# Altium integrated library Lattice CPLD ispLSI.IntLib: 471 symbols (part 13 of 26) (continued)
## ispLSI2192VE-100LB144 (continued)

## ispLSI2192VE-100LT128
designator U?
3.3V In-System Programmable SuperFAST High Density PLD; Published: 17-Jul-2002; LatestRevisionDate: 13-Apr-2006; LatestRevisionNote: IPC-7351 Footprint Added.; DatasheetVersion: Sep-2000; PackageVersion: Aug-2005; PackageReference: TQFP128; Publisher: Altium Limited; PackageDescription: 128-Pin Thin Quad Flat Pack 0.4 mm Pitch; ComponentLink1Description: Manufacturer Link; ComponentLink1URL: http://www.latticesemi.com/products/mature/index.cfm; ComponentLink2Description: Datasheet; ComponentLink2URL: http://www.latticesemi.com/account/_download.cfm?AMID=649
footprint TQFP128_N (Thin QFP, 128-Leads, Body 14x14mm, Pitch 0.4mm, IPC Medium Density)
footprint TQFP128_L (Thin QFP, 128-Leads, Body 14x14mm, Pitch 0.4mm, IPC High Density)
footprint TQFP128_M (Thin QFP, 128-Leads, Body 14x14mm, Pitch 0.4mm, IPC Low Density)
3D model 2192VE-TQFP128 (128-Pin Thin Quad Flat Pack 0.4 mm Pitch)
pins: 1 I/O85 (io), 2 VCC (power), 3 I/O86 (io), 4 I/O87 (io), 5 I/O88 (io), 6 I/O89 (io), 7 I/O90 (io), 8 I/O91 (io), 9 I/O92 (io), 10 I/O93 (io), 11 I/O94 (io), 12 I/O95 (io), 13 IN10 (in), 14 Y0 (in), 15 ~{RESE}T (in), 16 VCC (power), 17 GOE1 (in), 18 GND (power), 19 ~{BSCAN} (in), 20 TDI/IN0 (in), 21 I/O0 (io), 22 I/O1 (io), 23 I/O2 (io), 24 I/O3 (io), 25 I/O4 (io), 26 I/O5 (io), 27 I/O6 (io), 28 I/O7 (io), 29 I/O8 (io), 30 I/O9 (io), 31 VCC (power), 32 I/O10 (io), 33 I/O11 (io), 34 GND (power), 35 I/O12 (io), 36 I/O13 (io), 37 I/O14 (io), 38 I/O15 (io), 39 I/O16 (io), 40 I/O17 (io), 41 I/O18 (io), 42 I/O19 (io), 43 I/O20 (io), 44 I/O21 (io), 45 I/O22 (io), 46 I/O23 (io), 47 VCC (power), 48 TMS/IN1 (in), 49 IN3 (in), 50 GND (power), 51 I/O24 (io), 52 I/O25 (io), 53 I/O26 (io), 54 I/O27 (io), 55 I/O28 (io), 56 I/O29 (io), 57 I/O30 (io), 58 I/O31 (io), 59 I/O32 (io), 60 I/O33 (io), 61 I/O34 (io), 62 I/O35 (io), 63 GND (power), 64 I/O36 (io), 65 I/O37 (io), 66 VCC (power), 67 I/O38 (io), 68 I/O39 (io), 69 I/O40 (io), 70 I/O41 (io), 71 I/O42 (io), 72 I/O43 (io), 73 I/O44 (io), 74 I/O45 (io), 75 I/O46 (io), 76 I/O47 (io), 77 TCK/IN7 (in), 78 Y2 (in), 79 GND (power), 80 GOE0 (in), 81 VCC (power), 82 IN4 (in), 83 Y1 (in), 84 IN8 (in), 85 I/O48 (io), 86 I/O49 (io), 87 I/O50 (io), 88 I/O51 (io), 89 I/O52 (io), 90 I/O53 (io), 91 I/O54 (io), 92 I/O55 (io), 93 I/O56 (io), 94 I/O57 (io), 95 VCC (power), 96 I/O58 (io), 97 I/O59 (io), 98 GND (power), 99 I/O60 (io), 100 I/O61 (io), 101 I/O62 (io), 102 I/O63 (io), 103 I/O64 (io), 104 I/O65 (io), 105 I/O66 (io), 106 I/O67 (io), 107 I/O68 (io), 108 I/O69 (io), 109 I/O70 (io), 110 I/O71 (io), 111 GND (power), 112 TDO/IN6 (io), 113 IN9 (in), 114 VCC (power), 115 I/O72 (io), 116 I/O73 (io), 117 I/O74 (io), 118 I/O75 (io), 119 I/O76 (io), 120 I/O77 (io), 121 I/O78 (io), 122 I/O79 (io), 123 I/O80 (io), 124 I/O81 (io), 125 I/O82 (io), 126 I/O83 (io), 127 GND (power), 128 I/O84 (io)

## ispLSI2192VE-135LB144
designator U?
3.3V In-System Programmable SuperFAST High Density PLD; Published: 17-Jul-2002; LatestRevisionDate: 13-Apr-2006; LatestRevisionNote: IPC-7351 Footprint Added.; DatasheetVersion: Sep-2000; PackageVersion: pkg_32, Aug-2005; PackageReference: fpBGA144; Publisher: Altium Limited; PackageDescription: 144-Ball Fine Pitch Ball Grid Array (fpBGA144); Code_IPC: BGA100P12X12-144; ComponentLink1Description: Manufacturer Link; ComponentLink1URL: http://www.latticesemi.com/products/mature/index.cfm; ComponentLink2Description: Datasheet; ComponentLink2URL: http://www.latticesemi.com/account/_download.cfm?AMID=649
footprint fpBGA144 (BGA, 144-Leads, Body 13x13mm, Pitch 1mm)
3D model 2192VE-fpBGA144 (144-Ball Fine Pitch Ball Grid Array (fpBGA144))
pins: A1 GND (power), A2 I/O88 (io), A3 I/O84 (io), A4 I/O81 (io), A5 I/O77 (io), A6 I/O73 (io), A7 I/O70 (io), A8 I/O68 (io), A9 I/O64 (io), A10 I/O61 (io), A11 I/O59 (io), A12 GND (power), B1 VCC (power), B2 I/O86 (io), B3 I/O83 (io), B4 I/O80 (io), B5 I/O75 (io), B6 IN9 (in), B7 I/O69 (io), B8 I/O66 (io), B9 I/O63 (io), B10 I/O60 (io), B11 I/O56 (io), B12 VCC (power), C1 I/O91 (io), C2 I/O85 (io), C3 I/O82 (io), C4 I/O79 (io), C5 I/O76 (io), C6 I/O72 (io), C7 TDO/IN6 (io), C8 I/O67 (io), C9 I/O62 (io), C10 I/O58 (io), C11 I/O57 (io), C12 I/O53 (io), D1 I/O94 (io), D2 I/O87 (io), D3 I/O89 (io), D4 GND (power), D5 I/O78 (io), D6 I/O74 (io), D7 I/O71 (io), D8 I/O65 (io), D9 GND (power), D10 I/O54 (io), D11 I/O55 (io), D12 I/O49 (io), E1 IN11 (in), E2 I/O90 (io), E3 I/O92 (io), E4 I/O93 (io), E5 GND (power), E6 VCC (power), E7 VCC (power), E8 GND (power), E9 I/O50 (io), E10 I/O51 (io), E11 I/O52 (io), E12 IN8 (in), F1 ~{BSCAN} (in), F2 IN10 (in), F3 Y0 (in), F4 I/O95 (io), F5 VCC (power), F6 GND (power), F7 GND (power), F8 VCC (power), F9 IN4 (in), F10 Y1 (in), F11 I/O48 (io), F12 GOE0 (in), G1 I/O1 (io), G2 GOE1 (in), G3 TDI/IN0 (in), G4 ~{RESET} (in), G5 VCC (power), G6 GND (power), G7 GND (power), G8 VCC (power), G9 I/O47 (io), G10 IN5 (in), G11 Y2 (in), G12 TCK/IN7 (in), H1 I/O3 (io), H2 I/O2 (io), H3 I/O4 (io), H4 I/O0 (io), H5 GND (power), H6 VCC (power), H7 VCC (power), H8 GND (power), H9 I/O43 (io), H10 I/O46 (io), H11 I/O44 (io), H12 I/O45 (io), J1 I/O5 (io), J2 I/O8 (io), J3 I/O6 (io), J4 GND (power), J5 I/O17 (io), J6 TMS/IN1 (in), J7 IN3 (in), J8 I/O26 (io), J9 GND (power), J10 I/O42 (io), J11 I/O40 (io), J12 I/O41 (io), K1 I/O7 (io), K2 NC, K3 I/O12 (io), K4 I/O15 (io), K5 I/O19 (io), K6 I/O23 (io), K7 I/O25 (io), K8 I/O29 (io), K9 I/O32 (io), K10 I/O36 (io), K11 I/O37 (io), K12 I/O39 (io), L1 VCC (power), L2 I/O10 (io), L3 I/O11 (io), L4 I/O14 (io), L5 I/O20 (io), L6 I/O22 (io), L7 I/O24 (io), L8 I/O28 (io), L9 I/O31 (io), L10 I/O34 (io), L11 I/O38 (io), L12 VCC (power), M1 GND (power), M2 I/O9 (io), M3 I/O13 (io), M4 I/O16 (io), M5 I/O18 (io), M6 I/O21 (io), M7 IN2 (in), M8 I/O27 (io), M9 I/O30 (io), M10 I/O33 (io), M11 I/O35 (io), M12 GND (power)

## ispLSI2192VE-135LT128
designator U?
3.3V In-System Programmable SuperFAST High Density PLD; Published: 17-Jul-2002; LatestRevisionDate: 13-Apr-2006; LatestRevisionNote: IPC-7351 Footprint Added.; DatasheetVersion: Sep-2000; PackageVersion: Aug-2005; PackageReference: TQFP128; Publisher: Altium Limited; PackageDescription: 128-Pin Thin Quad Flat Pack 0.4 mm Pitch; ComponentLink1Description: Manufacturer Link; ComponentLink1URL: http://www.latticesemi.com/products/mature/index.cfm; ComponentLink2Description: Datasheet; ComponentLink2URL: http://www.latticesemi.com/account/_download.cfm?AMID=649
footprint TQFP128_N (Thin QFP, 128-Leads, Body 14x14mm, Pitch 0.4mm, IPC Medium Density)
footprint TQFP128_L (Thin QFP, 128-Leads, Body 14x14mm, Pitch 0.4mm, IPC High Density)
footprint TQFP128_M (Thin QFP, 128-Leads, Body 14x14mm, Pitch 0.4mm, IPC Low Density)
3D model 2192VE-TQFP128 (128-Pin Thin Quad Flat Pack 0.4 mm Pitch)
pins: 1 I/O85 (io), 2 VCC (power), 3 I/O86 (io), 4 I/O87 (io), 5 I/O88 (io), 6 I/O89 (io), 7 I/O90 (io), 8 I/O91 (io), 9 I/O92 (io), 10 I/O93 (io), 11 I/O94 (io), 12 I/O95 (io), 13 IN10 (in), 14 Y0 (in), 15 ~{RESE}T (in), 16 VCC (power), 17 GOE1 (in), 18 GND (power), 19 ~{BSCAN} (in), 20 TDI/IN0 (in), 21 I/O0 (io), 22 I/O1 (io), 23 I/O2 (io), 24 I/O3 (io), 25 I/O4 (io), 26 I/O5 (io), 27 I/O6 (io), 28 I/O7 (io), 29 I/O8 (io), 30 I/O9 (io), 31 VCC (power), 32 I/O10 (io), 33 I/O11 (io), 34 GND (power), 35 I/O12 (io), 36 I/O13 (io), 37 I/O14 (io), 38 I/O15 (io), 39 I/O16 (io), 40 I/O17 (io), 41 I/O18 (io), 42 I/O19 (io), 43 I/O20 (io), 44 I/O21 (io), 45 I/O22 (io), 46 I/O23 (io), 47 VCC (power), 48 TMS/IN1 (in), 49 IN3 (in), 50 GND (power), 51 I/O24 (io), 52 I/O25 (io), 53 I/O26 (io), 54 I/O27 (io), 55 I/O28 (io), 56 I/O29 (io), 57 I/O30 (io), 58 I/O31 (io), 59 I/O32 (io), 60 I/O33 (io), 61 I/O34 (io), 62 I/O35 (io), 63 GND (power), 64 I/O36 (io), 65 I/O37 (io), 66 VCC (power), 67 I/O38 (io), 68 I/O39 (io), 69 I/O40 (io), 70 I/O41 (io), 71 I/O42 (io), 72 I/O43 (io), 73 I/O44 (io), 74 I/O45 (io), 75 I/O46 (io), 76 I/O47 (io), 77 TCK/IN7 (in), 78 Y2 (in), 79 GND (power), 80 GOE0 (in), 81 VCC (power), 82 IN4 (in), 83 Y1 (in), 84 IN8 (in), 85 I/O48 (io), 86 I/O49 (io), 87 I/O50 (io), 88 I/O51 (io), 89 I/O52 (io), 90 I/O53 (io), 91 I/O54 (io), 92 I/O55 (io), 93 I/O56 (io), 94 I/O57 (io), 95 VCC (power), 96 I/O58 (io), 97 I/O59 (io), 98 GND (power), 99 I/O60 (io), 100 I/O61 (io), 101 I/O62 (io), 102 I/O63 (io), 103 I/O64 (io), 104 I/O65 (io), 105 I/O66 (io), 106 I/O67 (io), 107 I/O68 (io), 108 I/O69 (io), 109 I/O70 (io), 110 I/O71 (io), 111 GND (power), 112 TDO/IN6 (io), 113 IN9 (in), 114 VCC (power), 115 I/O72 (io), 116 I/O73 (io), 117 I/O74 (io), 118 I/O75 (io), 119 I/O76 (io), 120 I/O77 (io), 121 I/O78 (io), 122 I/O79 (io), 123 I/O80 (io), 124 I/O81 (io), 125 I/O82 (io), 126 I/O83 (io), 127 GND (power), 128 I/O84 (io)

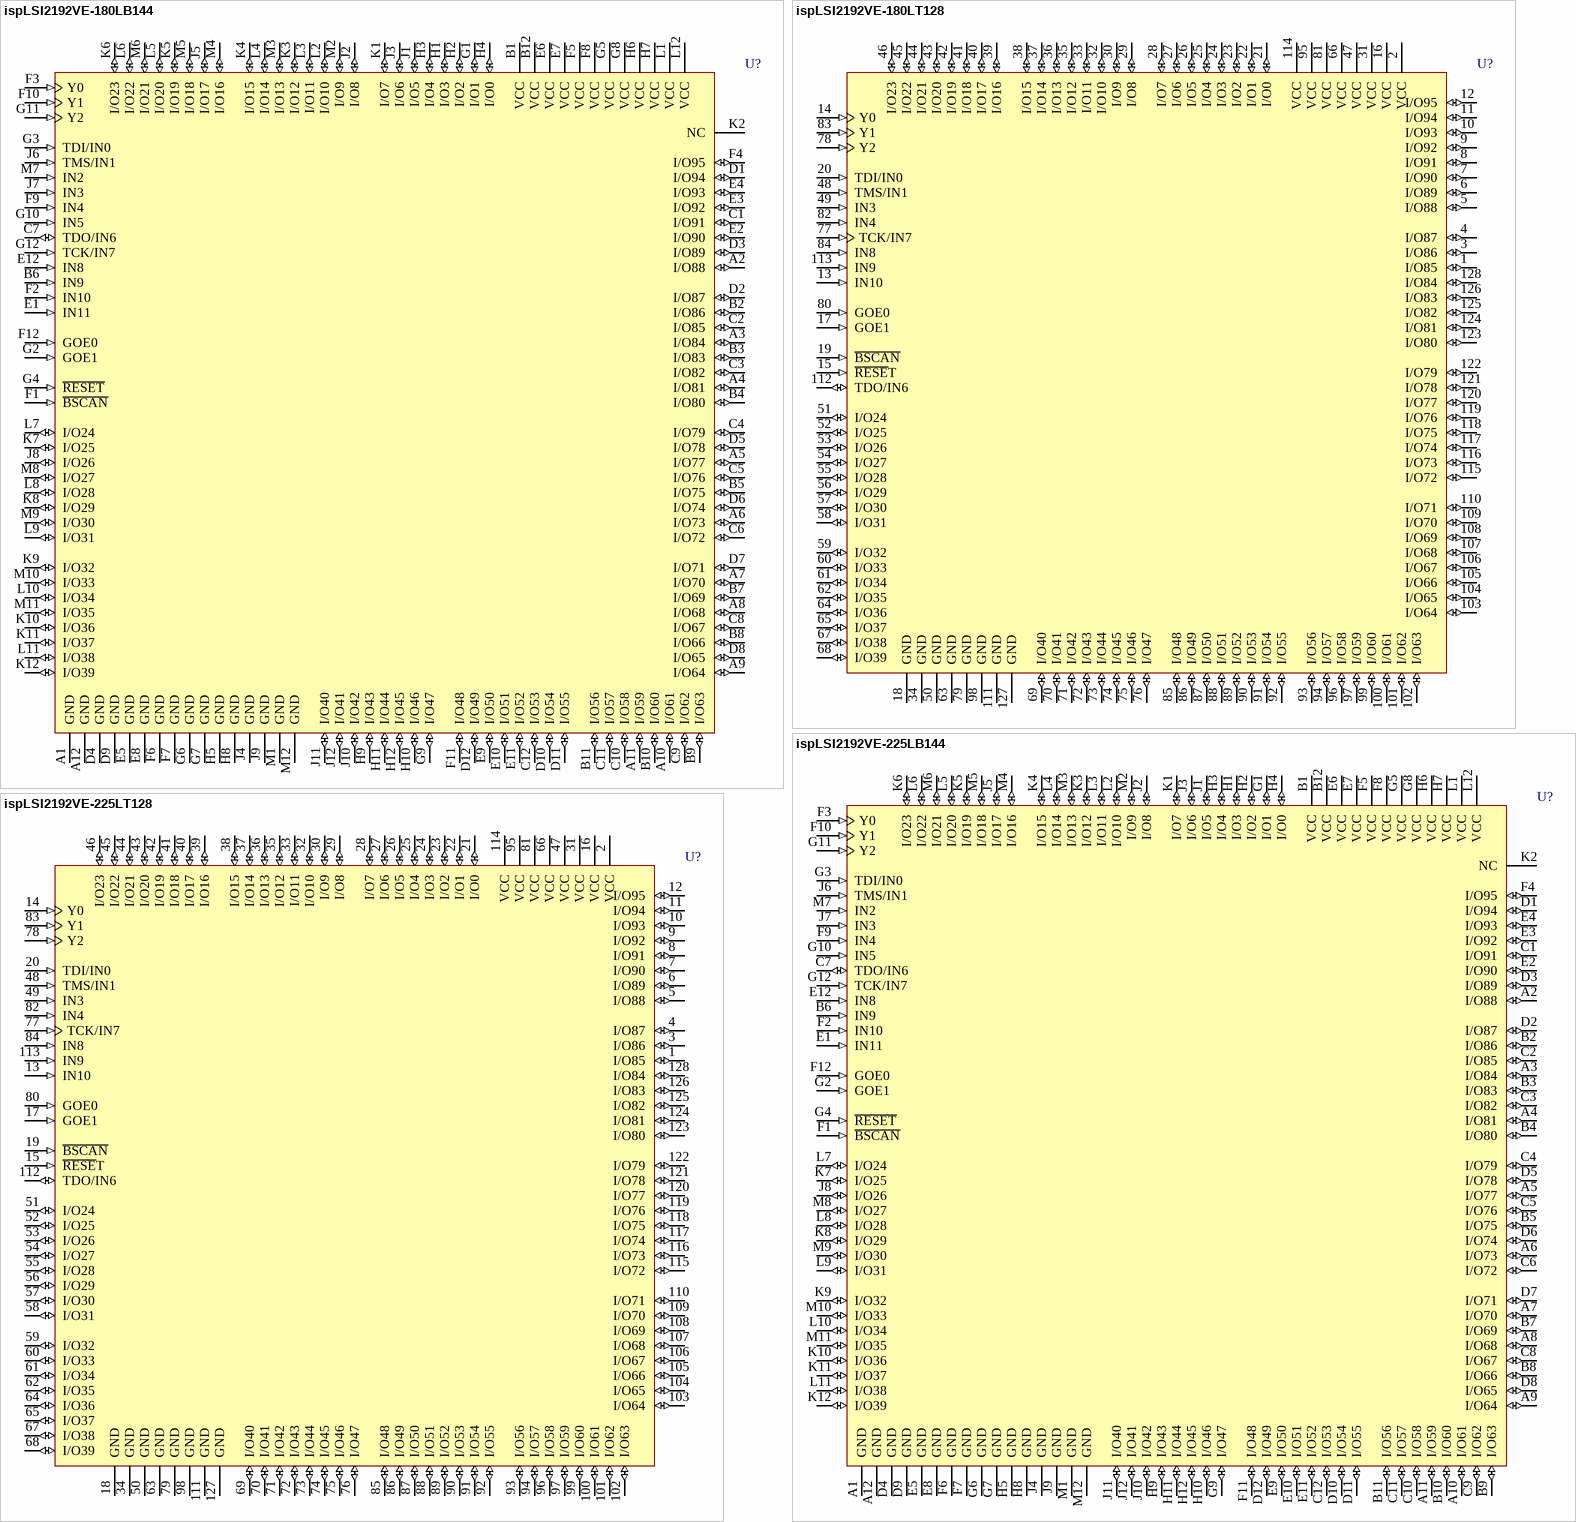
[diagram p110: symbols ispLSI2192VE-180LB144 to ispLSI2192VE-225LT128]

## ispLSI2192VE-180LB144
designator U?
3.3V In-System Programmable SuperFAST High Density PLD; Published: 17-Jul-2002; LatestRevisionDate: 13-Apr-2006; LatestRevisionNote: IPC-7351 Footprint Added.; DatasheetVersion: Sep-2000; PackageVersion: pkg_32, Aug-2005; PackageReference: fpBGA144; Publisher: Altium Limited; PackageDescription: 144-Ball Fine Pitch Ball Grid Array (fpBGA144); Code_IPC: BGA100P12X12-144; ComponentLink1Description: Manufacturer Link; ComponentLink1URL: http://www.latticesemi.com/products/mature/index.cfm; ComponentLink2Description: Datasheet; ComponentLink2URL: http://www.latticesemi.com/account/_download.cfm?AMID=649
footprint fpBGA144 (BGA, 144-Leads, Body 13x13mm, Pitch 1mm)
3D model 2192VE-fpBGA144 (144-Ball Fine Pitch Ball Grid Array (fpBGA144))
pins: A1 GND (power), A2 I/O88 (io), A3 I/O84 (io), A4 I/O81 (io), A5 I/O77 (io), A6 I/O73 (io), A7 I/O70 (io), A8 I/O68 (io), A9 I/O64 (io), A10 I/O61 (io), A11 I/O59 (io), A12 GND (power), B1 VCC (power), B2 I/O86 (io), B3 I/O83 (io), B4 I/O80 (io), B5 I/O75 (io), B6 IN9 (in), B7 I/O69 (io), B8 I/O66 (io), B9 I/O63 (io), B10 I/O60 (io), B11 I/O56 (io), B12 VCC (power), C1 I/O91 (io), C2 I/O85 (io), C3 I/O82 (io), C4 I/O79 (io), C5 I/O76 (io), C6 I/O72 (io), C7 TDO/IN6 (io), C8 I/O67 (io), C9 I/O62 (io), C10 I/O58 (io), C11 I/O57 (io), C12 I/O53 (io), D1 I/O94 (io), D2 I/O87 (io), D3 I/O89 (io), D4 GND (power), D5 I/O78 (io), D6 I/O74 (io), D7 I/O71 (io), D8 I/O65 (io), D9 GND (power), D10 I/O54 (io), D11 I/O55 (io), D12 I/O49 (io), E1 IN11 (in), E2 I/O90 (io), E3 I/O92 (io), E4 I/O93 (io), E5 GND (power), E6 VCC (power), E7 VCC (power), E8 GND (power), E9 I/O50 (io), E10 I/O51 (io), E11 I/O52 (io), E12 IN8 (in), F1 ~{BSCAN} (in), F2 IN10 (in), F3 Y0 (in), F4 I/O95 (io), F5 VCC (power), F6 GND (power), F7 GND (power), F8 VCC (power), F9 IN4 (in), F10 Y1 (in), F11 I/O48 (io), F12 GOE0 (in), G1 I/O1 (io), G2 GOE1 (in), G3 TDI/IN0 (in), G4 ~{RESET} (in), G5 VCC (power), G6 GND (power), G7 GND (power), G8 VCC (power), G9 I/O47 (io), G10 IN5 (in), G11 Y2 (in), G12 TCK/IN7 (in), H1 I/O3 (io), H2 I/O2 (io), H3 I/O4 (io), H4 I/O0 (io), H5 GND (power), H6 VCC (power), H7 VCC (power), H8 GND (power), H9 I/O43 (io), H10 I/O46 (io), H11 I/O44 (io), H12 I/O45 (io), J1 I/O5 (io), J2 I/O8 (io), J3 I/O6 (io), J4 GND (power), J5 I/O17 (io), J6 TMS/IN1 (in), J7 IN3 (in), J8 I/O26 (io), J9 GND (power), J10 I/O42 (io), J11 I/O40 (io), J12 I/O41 (io), K1 I/O7 (io), K2 NC, K3 I/O12 (io), K4 I/O15 (io), K5 I/O19 (io), K6 I/O23 (io), K7 I/O25 (io), K8 I/O29 (io), K9 I/O32 (io), K10 I/O36 (io), K11 I/O37 (io), K12 I/O39 (io), L1 VCC (power), L2 I/O10 (io), L3 I/O11 (io), L4 I/O14 (io), L5 I/O20 (io), L6 I/O22 (io), L7 I/O24 (io), L8 I/O28 (io), L9 I/O31 (io), L10 I/O34 (io), L11 I/O38 (io), L12 VCC (power), M1 GND (power), M2 I/O9 (io), M3 I/O13 (io), M4 I/O16 (io), M5 I/O18 (io), M6 I/O21 (io), M7 IN2 (in), M8 I/O27 (io), M9 I/O30 (io), M10 I/O33 (io), M11 I/O35 (io), M12 GND (power)

## ispLSI2192VE-180LT128
designator U?
3.3V In-System Programmable SuperFAST High Density PLD; Published: 17-Jul-2002; LatestRevisionDate: 13-Apr-2006; LatestRevisionNote: IPC-7351 Footprint Added.; DatasheetVersion: Sep-2000; PackageVersion: Aug-2005; PackageReference: TQFP128; Publisher: Altium Limited; PackageDescription: 128-Pin Thin Quad Flat Pack 0.4 mm Pitch; ComponentLink1Description: Manufacturer Link; ComponentLink1URL: http://www.latticesemi.com/products/mature/index.cfm; ComponentLink2Description: Datasheet; ComponentLink2URL: http://www.latticesemi.com/account/_download.cfm?AMID=649
footprint TQFP128_N (Thin QFP, 128-Leads, Body 14x14mm, Pitch 0.4mm, IPC Medium Density)
footprint TQFP128_L (Thin QFP, 128-Leads, Body 14x14mm, Pitch 0.4mm, IPC High Density)
footprint TQFP128_M (Thin QFP, 128-Leads, Body 14x14mm, Pitch 0.4mm, IPC Low Density)
3D model 2192VE-TQFP128 (128-Pin Thin Quad Flat Pack 0.4 mm Pitch)
pins: 1 I/O85 (io), 2 VCC (power), 3 I/O86 (io), 4 I/O87 (io), 5 I/O88 (io), 6 I/O89 (io), 7 I/O90 (io), 8 I/O91 (io), 9 I/O92 (io), 10 I/O93 (io), 11 I/O94 (io), 12 I/O95 (io), 13 IN10 (in), 14 Y0 (in), 15 ~{RESE}T (in), 16 VCC (power), 17 GOE1 (in), 18 GND (power), 19 ~{BSCAN} (in), 20 TDI/IN0 (in), 21 I/O0 (io), 22 I/O1 (io), 23 I/O2 (io), 24 I/O3 (io), 25 I/O4 (io), 26 I/O5 (io), 27 I/O6 (io), 28 I/O7 (io), 29 I/O8 (io), 30 I/O9 (io), 31 VCC (power), 32 I/O10 (io), 33 I/O11 (io), 34 GND (power), 35 I/O12 (io), 36 I/O13 (io), 37 I/O14 (io), 38 I/O15 (io), 39 I/O16 (io), 40 I/O17 (io), 41 I/O18 (io), 42 I/O19 (io), 43 I/O20 (io), 44 I/O21 (io), 45 I/O22 (io), 46 I/O23 (io), 47 VCC (power), 48 TMS/IN1 (in), 49 IN3 (in), 50 GND (power), 51 I/O24 (io), 52 I/O25 (io), 53 I/O26 (io), 54 I/O27 (io), 55 I/O28 (io), 56 I/O29 (io), 57 I/O30 (io), 58 I/O31 (io), 59 I/O32 (io), 60 I/O33 (io), 61 I/O34 (io), 62 I/O35 (io), 63 GND (power), 64 I/O36 (io), 65 I/O37 (io), 66 VCC (power), 67 I/O38 (io), 68 I/O39 (io), 69 I/O40 (io), 70 I/O41 (io), 71 I/O42 (io), 72 I/O43 (io), 73 I/O44 (io), 74 I/O45 (io), 75 I/O46 (io), 76 I/O47 (io), 77 TCK/IN7 (in), 78 Y2 (in), 79 GND (power), 80 GOE0 (in), 81 VCC (power), 82 IN4 (in), 83 Y1 (in), 84 IN8 (in), 85 I/O48 (io), 86 I/O49 (io), 87 I/O50 (io), 88 I/O51 (io), 89 I/O52 (io), 90 I/O53 (io), 91 I/O54 (io), 92 I/O55 (io), 93 I/O56 (io), 94 I/O57 (io), 95 VCC (power), 96 I/O58 (io), 97 I/O59 (io), 98 GND (power), 99 I/O60 (io), 100 I/O61 (io), 101 I/O62 (io), 102 I/O63 (io), 103 I/O64 (io), 104 I/O65 (io), 105 I/O66 (io), 106 I/O67 (io), 107 I/O68 (io), 108 I/O69 (io), 109 I/O70 (io), 110 I/O71 (io), 111 GND (power), 112 TDO/IN6 (io), 113 IN9 (in), 114 VCC (power), 115 I/O72 (io), 116 I/O73 (io), 117 I/O74 (io), 118 I/O75 (io), 119 I/O76 (io), 120 I/O77 (io), 121 I/O78 (io), 122 I/O79 (io), 123 I/O80 (io), 124 I/O81 (io), 125 I/O82 (io), 126 I/O83 (io), 127 GND (power), 128 I/O84 (io)

## ispLSI2192VE-225LB144
designator U?
3.3V In-System Programmable SuperFAST High Density PLD; Published: 17-Jul-2002; LatestRevisionDate: 13-Apr-2006; LatestRevisionNote: IPC-7351 Footprint Added.; DatasheetVersion: Sep-2000; PackageVersion: pkg_32, Aug-2005; PackageReference: fpBGA144; Publisher: Altium Limited; PackageDescription: 144-Ball Fine Pitch Ball Grid Array (fpBGA144); Code_IPC: BGA100P12X12-144; ComponentLink1Description: Manufacturer Link; ComponentLink1URL: http://www.latticesemi.com/products/mature/index.cfm; ComponentLink2Description: Datasheet; ComponentLink2URL: http://www.latticesemi.com/account/_download.cfm?AMID=649
footprint fpBGA144 (BGA, 144-Leads, Body 13x13mm, Pitch 1mm)
3D model 2192VE-fpBGA144 (144-Ball Fine Pitch Ball Grid Array (fpBGA144))
pins: A1 GND (power), A2 I/O88 (io), A3 I/O84 (io), A4 I/O81 (io), A5 I/O77 (io), A6 I/O73 (io), A7 I/O70 (io), A8 I/O68 (io), A9 I/O64 (io), A10 I/O61 (io), A11 I/O59 (io), A12 GND (power), B1 VCC (power), B2 I/O86 (io), B3 I/O83 (io), B4 I/O80 (io), B5 I/O75 (io), B6 IN9 (in), B7 I/O69 (io), B8 I/O66 (io), B9 I/O63 (io), B10 I/O60 (io), B11 I/O56 (io), B12 VCC (power), C1 I/O91 (io), C2 I/O85 (io), C3 I/O82 (io), C4 I/O79 (io), C5 I/O76 (io), C6 I/O72 (io), C7 TDO/IN6 (io), C8 I/O67 (io), C9 I/O62 (io), C10 I/O58 (io), C11 I/O57 (io), C12 I/O53 (io), D1 I/O94 (io), D2 I/O87 (io), D3 I/O89 (io), D4 GND (power), D5 I/O78 (io), D6 I/O74 (io), D7 I/O71 (io), D8 I/O65 (io), D9 GND (power), D10 I/O54 (io), D11 I/O55 (io), D12 I/O49 (io), E1 IN11 (in), E2 I/O90 (io), E3 I/O92 (io), E4 I/O93 (io), E5 GND (power), E6 VCC (power), E7 VCC (power), E8 GND (power), E9 I/O50 (io), E10 I/O51 (io), E11 I/O52 (io), E12 IN8 (in), F1 ~{BSCAN} (in), F2 IN10 (in), F3 Y0 (in), F4 I/O95 (io), F5 VCC (power), F6 GND (power), F7 GND (power), F8 VCC (power), F9 IN4 (in), F10 Y1 (in), F11 I/O48 (io), F12 GOE0 (in), G1 I/O1 (io), G2 GOE1 (in), G3 TDI/IN0 (in), G4 ~{RESET} (in), G5 VCC (power), G6 GND (power), G7 GND (power), G8 VCC (power), G9 I/O47 (io), G10 IN5 (in), G11 Y2 (in), G12 TCK/IN7 (in), H1 I/O3 (io), H2 I/O2 (io), H3 I/O4 (io), H4 I/O0 (io), H5 GND (power), H6 VCC (power), H7 VCC (power), H8 GND (power), H9 I/O43 (io), H10 I/O46 (io), H11 I/O44 (io), H12 I/O45 (io), J1 I/O5 (io), J2 I/O8 (io), J3 I/O6 (io), J4 GND (power), J5 I/O17 (io), J6 TMS/IN1 (in), J7 IN3 (in), J8 I/O26 (io), J9 GND (power), J10 I/O42 (io), J11 I/O40 (io), J12 I/O41 (io), K1 I/O7 (io), K2 NC, K3 I/O12 (io), K4 I/O15 (io), K5 I/O19 (io), K6 I/O23 (io), K7 I/O25 (io), K8 I/O29 (io), K9 I/O32 (io), K10 I/O36 (io), K11 I/O37 (io), K12 I/O39 (io), L1 VCC (power), L2 I/O10 (io), L3 I/O11 (io), L4 I/O14 (io), L5 I/O20 (io), L6 I/O22 (io), L7 I/O24 (io), L8 I/O28 (io), L9 I/O31 (io), L10 I/O34 (io), L11 I/O38 (io), L12 VCC (power), M1 GND (power), M2 I/O9 (io), M3 I/O13 (io), M4 I/O16 (io), M5 I/O18 (io), M6 I/O21 (io), M7 IN2 (in), M8 I/O27 (io), M9 I/O30 (io), M10 I/O33 (io), M11 I/O35 (io), M12 GND (power)

## ispLSI2192VE-225LT128
designator U?
3.3V In-System Programmable SuperFAST High Density PLD; Published: 17-Jul-2002; LatestRevisionDate: 13-Apr-2006; LatestRevisionNote: IPC-7351 Footprint Added.; DatasheetVersion: Sep-2000; PackageVersion: Aug-2005; PackageReference: TQFP128; Publisher: Altium Limited; PackageDescription: 128-Pin Thin Quad Flat Pack 0.4 mm Pitch; ComponentLink1Description: Manufacturer Link; ComponentLink1URL: http://www.latticesemi.com/products/mature/index.cfm; ComponentLink2Description: Datasheet; ComponentLink2URL: http://www.latticesemi.com/account/_download.cfm?AMID=649
footprint TQFP128_N (Thin QFP, 128-Leads, Body 14x14mm, Pitch 0.4mm, IPC Medium Density)
footprint TQFP128_L (Thin QFP, 128-Leads, Body 14x14mm, Pitch 0.4mm, IPC High Density)
footprint TQFP128_M (Thin QFP, 128-Leads, Body 14x14mm, Pitch 0.4mm, IPC Low Density)
3D model 2192VE-TQFP128 (128-Pin Thin Quad Flat Pack 0.4 mm Pitch)
pins: 1 I/O85 (io), 2 VCC (power), 3 I/O86 (io), 4 I/O87 (io), 5 I/O88 (io), 6 I/O89 (io), 7 I/O90 (io), 8 I/O91 (io), 9 I/O92 (io), 10 I/O93 (io), 11 I/O94 (io), 12 I/O95 (io), 13 IN10 (in), 14 Y0 (in), 15 ~{RESE}T (in), 16 VCC (power), 17 GOE1 (in), 18 GND (power), 19 ~{BSCAN} (in), 20 TDI/IN0 (in), 21 I/O0 (io), 22 I/O1 (io), 23 I/O2 (io), 24 I/O3 (io), 25 I/O4 (io), 26 I/O5 (io), 27 I/O6 (io), 28 I/O7 (io), 29 I/O8 (io), 30 I/O9 (io), 31 VCC (power), 32 I/O10 (io), 33 I/O11 (io), 34 GND (power), 35 I/O12 (io), 36 I/O13 (io), 37 I/O14 (io), 38 I/O15 (io), 39 I/O16 (io), 40 I/O17 (io), 41 I/O18 (io), 42 I/O19 (io), 43 I/O20 (io), 44 I/O21 (io), 45 I/O22 (io), 46 I/O23 (io), 47 VCC (power), 48 TMS/IN1 (in), 49 IN3 (in), 50 GND (power), 51 I/O24 (io), 52 I/O25 (io), 53 I/O26 (io), 54 I/O27 (io), 55 I/O28 (io), 56 I/O29 (io), 57 I/O30 (io), 58 I/O31 (io), 59 I/O32 (io), 60 I/O33 (io), 61 I/O34 (io), 62 I/O35 (io), 63 GND (power), 64 I/O36 (io), 65 I/O37 (io), 66 VCC (power), 67 I/O38 (io), 68 I/O39 (io), 69 I/O40 (io), 70 I/O41 (io), 71 I/O42 (io), 72 I/O43 (io), 73 I/O44 (io), 74 I/O45 (io), 75 I/O46 (io), 76 I/O47 (io), 77 TCK/IN7 (in), 78 Y2 (in), 79 GND (power), 80 GOE0 (in), 81 VCC (power), 82 IN4 (in), 83 Y1 (in), 84 IN8 (in), 85 I/O48 (io), 86 I/O49 (io), 87 I/O50 (io), 88 I/O51 (io), 89 I/O52 (io), 90 I/O53 (io), 91 I/O54 (io), 92 I/O55 (io), 93 I/O56 (io), 94 I/O57 (io), 95 VCC (power), 96 I/O58 (io), 97 I/O59 (io), 98 GND (power), 99 I/O60 (io), 100 I/O61 (io), 101 I/O62 (io), 102 I/O63 (io), 103 I/O64 (io), 104 I/O65 (io), 105 I/O66 (io), 106 I/O67 (io), 107 I/O68 (io), 108 I/O69 (io), 109 I/O70 (io), 110 I/O71 (io), 111 GND (power), 112 TDO/IN6 (io), 113 IN9 (in), 114 VCC (power), 115 I/O72 (io), 116 I/O73 (io), 117 I/O74 (io), 118 I/O75 (io), 119 I/O76 (io), 120 I/O77 (io), 121 I/O78 (io), 122 I/O79 (io), 123 I/O80 (io), 124 I/O81 (io), 125 I/O82 (io), 126 I/O83 (io), 127 GND (power), 128 I/O84 (io)

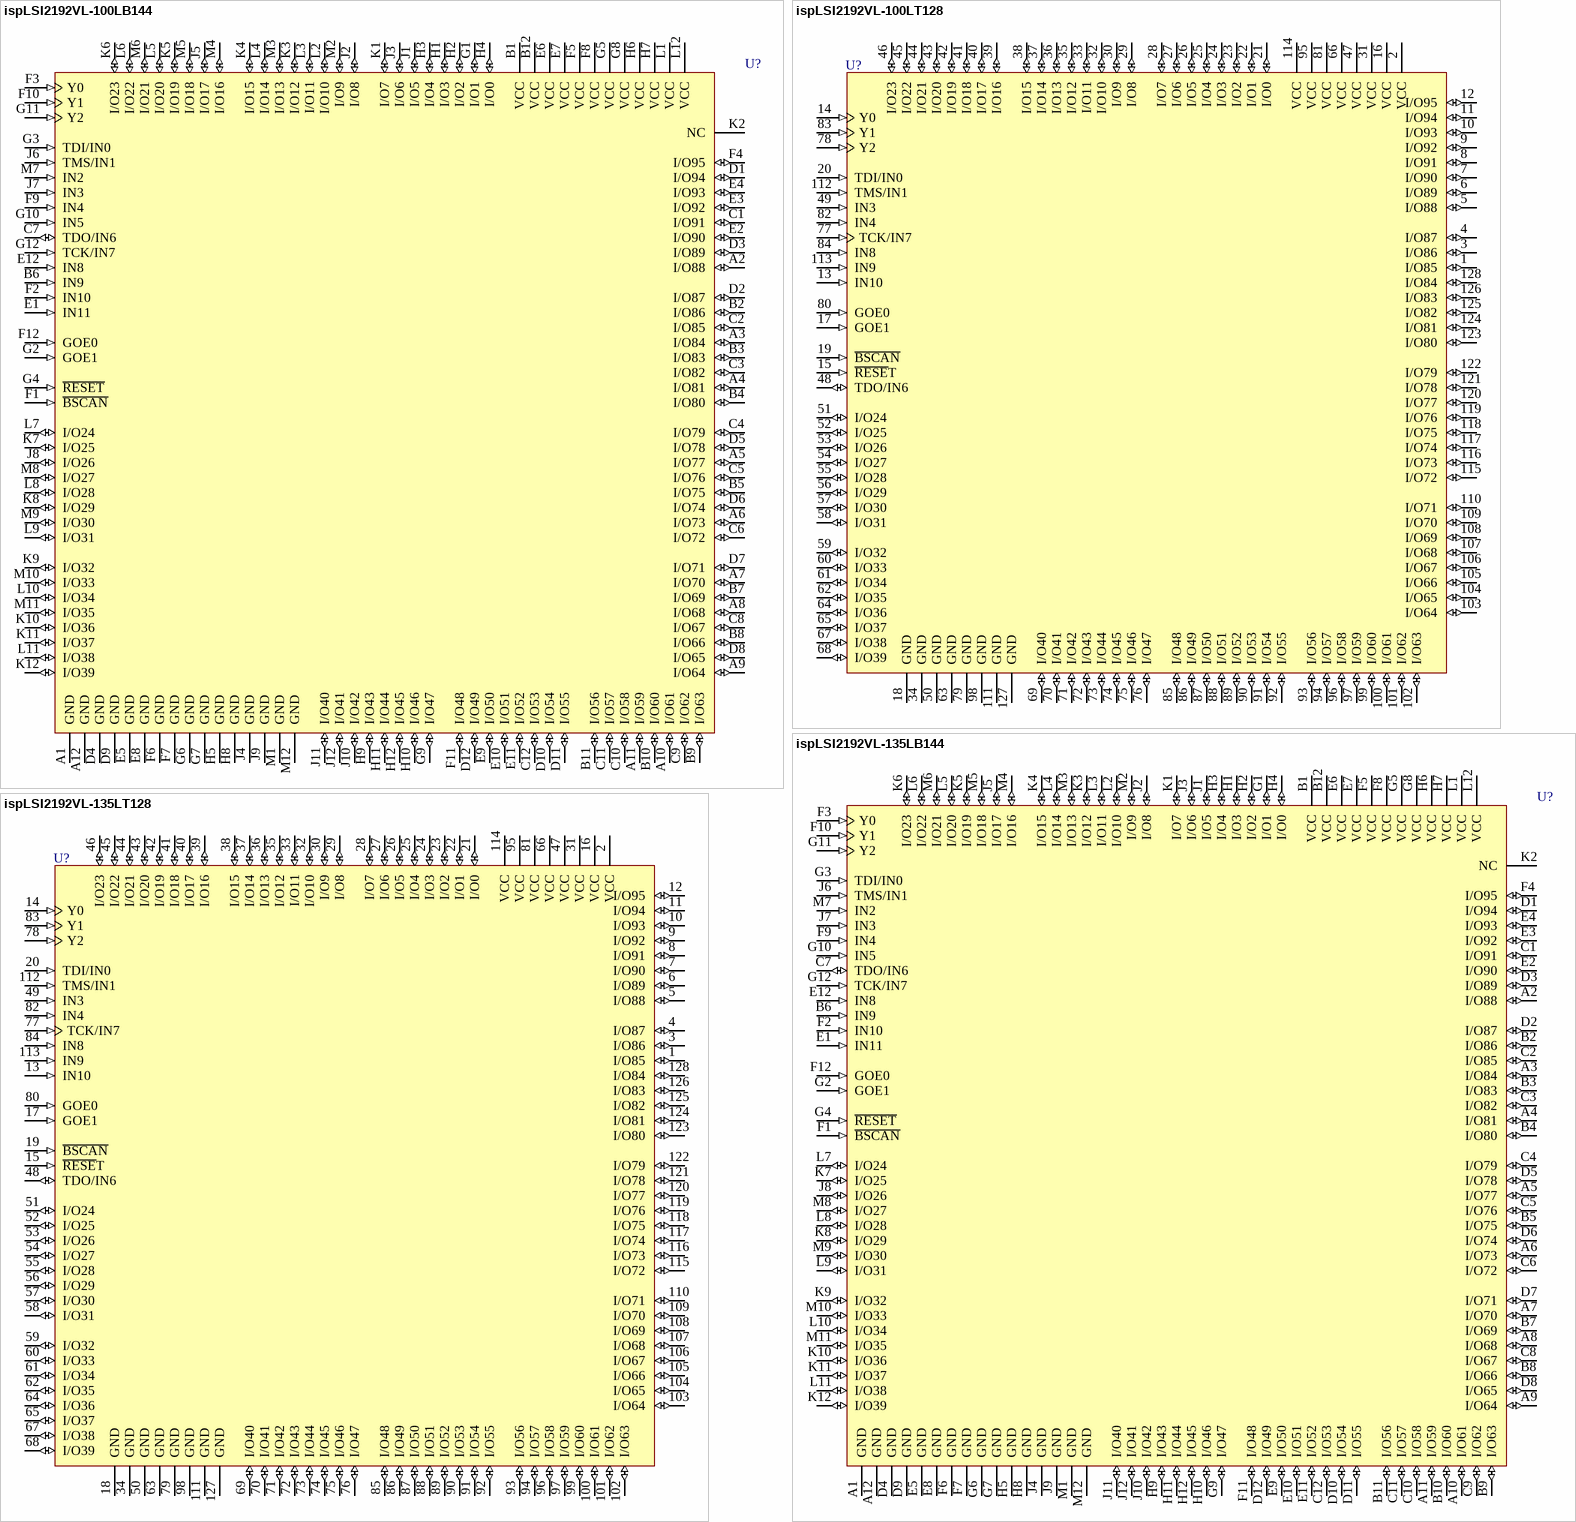
[diagram p111: symbols ispLSI2192VL-100LB144 to ispLSI2192VL-135LT128]

## ispLSI2192VL-100LB144
designator U?
2.5V In-System Programmable SuperFAST High Density PLD; Published: 17-Jul-2002; LatestRevisionDate: 13-Apr-2006; LatestRevisionNote: IPC-7351 Footprint Added.; DatasheetVersion: Oct-2000; PackageVersion: pkg_32, Aug-2005; PackageReference: fpBGA144; Publisher: Altium Limited; PackageDescription: 144-Ball Fine Pitch Ball Grid Array (fpBGA144); Code_IPC: BGA100P12X12-144; ComponentLink1Description: Manufacturer Link; ComponentLink1URL: http://www.latticesemi.com/products/mature/index.cfm; ComponentLink2Description: Datasheet; ComponentLink2URL: http://www.latticesemi.com/lit/docs/datasheets/cpld/2192vl.pdf
footprint fpBGA144 (BGA, 144-Leads, Body 13x13mm, Pitch 1mm)
3D model 2192VL-fpBGA144 (144-Ball Fine Pitch Ball Grid Array (fpBGA144))
pins: A1 GND (power), A2 I/O88 (io), A3 I/O84 (io), A4 I/O81 (io), A5 I/O77 (io), A6 I/O73 (io), A7 I/O70 (io), A8 I/O68 (io), A9 I/O64 (io), A10 I/O61 (io), A11 I/O59 (io), A12 GND (power), B1 VCC (power), B2 I/O86 (io), B3 I/O83 (io), B4 I/O80 (io), B5 I/O75 (io), B6 IN9 (in), B7 I/O69 (io), B8 I/O66 (io), B9 I/O63 (io), B10 I/O60 (io), B11 I/O56 (io), B12 VCC (power), C1 I/O91 (io), C2 I/O85 (io), C3 I/O82 (io), C4 I/O79 (io), C5 I/O76 (io), C6 I/O72 (io), C7 TDO/IN6 (io), C8 I/O67 (io), C9 I/O62 (io), C10 I/O58 (io), C11 I/O57 (io), C12 I/O53 (io), D1 I/O94 (io), D2 I/O87 (io), D3 I/O89 (io), D4 GND (power), D5 I/O78 (io), D6 I/O74 (io), D7 I/O71 (io), D8 I/O65 (io), D9 GND (power), D10 I/O54 (io), D11 I/O55 (io), D12 I/O49 (io), E1 IN11 (in), E2 I/O90 (io), E3 I/O92 (io), E4 I/O93 (io), E5 GND (power), E6 VCC (power), E7 VCC (power), E8 GND (power), E9 I/O50 (io), E10 I/O51 (io), E11 I/O52 (io), E12 IN8 (in), F1 ~{BSCAN} (in), F2 IN10 (in), F3 Y0 (in), F4 I/O95 (io), F5 VCC (power), F6 GND (power), F7 GND (power), F8 VCC (power), F9 IN4 (in), F10 Y1 (in), F11 I/O48 (io), F12 GOE0 (in), G1 I/O1 (io), G2 GOE1 (in), G3 TDI/IN0 (in), G4 ~{RESET} (in), G5 VCC (power), G6 GND (power), G7 GND (power), G8 VCC (power), G9 I/O47 (io), G10 IN5 (in), G11 Y2 (in), G12 TCK/IN7 (in), H1 I/O3 (io), H2 I/O2 (io), H3 I/O4 (io), H4 I/O0 (io), H5 GND (power), H6 VCC (power), H7 VCC (power), H8 GND (power), H9 I/O43 (io), H10 I/O46 (io), H11 I/O44 (io), H12 I/O45 (io), J1 I/O5 (io), J2 I/O8 (io), J3 I/O6 (io), J4 GND (power), J5 I/O17 (io), J6 TMS/IN1 (in), J7 IN3 (in), J8 I/O26 (io), J9 GND (power), J10 I/O42 (io), J11 I/O40 (io), J12 I/O41 (io), K1 I/O7 (io), K2 NC, K3 I/O12 (io), K4 I/O15 (io), K5 I/O19 (io), K6 I/O23 (io), K7 I/O25 (io), K8 I/O29 (io), K9 I/O32 (io), K10 I/O36 (io), K11 I/O37 (io), K12 I/O39 (io), L1 VCC (power), L2 I/O10 (io), L3 I/O11 (io), L4 I/O14 (io), L5 I/O20 (io), L6 I/O22 (io), L7 I/O24 (io), L8 I/O28 (io), L9 I/O31 (io), L10 I/O34 (io), L11 I/O38 (io), L12 VCC (power), M1 GND (power), M2 I/O9 (io), M3 I/O13 (io), M4 I/O16 (io), M5 I/O18 (io), M6 I/O21 (io), M7 IN2 (in), M8 I/O27 (io), M9 I/O30 (io), M10 I/O33 (io), M11 I/O35 (io), M12 GND (power)

## ispLSI2192VL-100LT128
designator U?
2.5V In-System Programmable SuperFAST High Density PLD; Published: 17-Jul-2002; LatestRevisionDate: 13-Apr-2006; LatestRevisionNote: IPC-7351 Footprint Added.; DatasheetVersion: Oct-2000; PackageVersion: Aug-2005; PackageReference: TQFP128; Publisher: Altium Limited; PackageDescription: 128-Pin Thin Quad Flat Pack 0.4 mm Pitch; ComponentLink1Description: Manufacturer Link; ComponentLink1URL: http://www.latticesemi.com/products/mature/index.cfm; ComponentLink2Description: Datasheet; ComponentLink2URL: http://www.latticesemi.com/lit/docs/datasheets/cpld/2192vl.pdf
footprint TQFP128_N (Thin QFP, 128-Leads, Body 14x14mm, Pitch 0.4mm, IPC Medium Density)
footprint TQFP128_L (Thin QFP, 128-Leads, Body 14x14mm, Pitch 0.4mm, IPC High Density)
footprint TQFP128_M (Thin QFP, 128-Leads, Body 14x14mm, Pitch 0.4mm, IPC Low Density)
3D model 2192VL-TQFP128 (128-Pin Thin Quad Flat Pack 0.4 mm Pitch)
pins: 1 I/O85 (io), 2 VCC (power), 3 I/O86 (io), 4 I/O87 (io), 5 I/O88 (io), 6 I/O89 (io), 7 I/O90 (io), 8 I/O91 (io), 9 I/O92 (io), 10 I/O93 (io), 11 I/O94 (io), 12 I/O95 (io), 13 IN10 (in), 14 Y0 (in), 15 ~{RESE}T (in), 16 VCC (power), 17 GOE1 (in), 18 GND (power), 19 ~{BSCAN} (in), 20 TDI/IN0 (in), 21 I/O0 (io), 22 I/O1 (io), 23 I/O2 (io), 24 I/O3 (io), 25 I/O4 (io), 26 I/O5 (io), 27 I/O6 (io), 28 I/O7 (io), 29 I/O8 (io), 30 I/O9 (io), 31 VCC (power), 32 I/O10 (io), 33 I/O11 (io), 34 GND (power), 35 I/O12 (io), 36 I/O13 (io), 37 I/O14 (io), 38 I/O15 (io), 39 I/O16 (io), 40 I/O17 (io), 41 I/O18 (io), 42 I/O19 (io), 43 I/O20 (io), 44 I/O21 (io), 45 I/O22 (io), 46 I/O23 (io), 47 VCC (power), 48 TDO/IN6 (io), 49 IN3 (in), 50 GND (power), 51 I/O24 (io), 52 I/O25 (io), 53 I/O26 (io), 54 I/O27 (io), 55 I/O28 (io), 56 I/O29 (io), 57 I/O30 (io), 58 I/O31 (io), 59 I/O32 (io), 60 I/O33 (io), 61 I/O34 (io), 62 I/O35 (io), 63 GND (power), 64 I/O36 (io), 65 I/O37 (io), 66 VCC (power), 67 I/O38 (io), 68 I/O39 (io), 69 I/O40 (io), 70 I/O41 (io), 71 I/O42 (io), 72 I/O43 (io), 73 I/O44 (io), 74 I/O45 (io), 75 I/O46 (io), 76 I/O47 (io), 77 TCK/IN7 (in), 78 Y2 (in), 79 GND (power), 80 GOE0 (in), 81 VCC (power), 82 IN4 (in), 83 Y1 (in), 84 IN8 (in), 85 I/O48 (io), 86 I/O49 (io), 87 I/O50 (io), 88 I/O51 (io), 89 I/O52 (io), 90 I/O53 (io), 91 I/O54 (io), 92 I/O55 (io), 93 I/O56 (io), 94 I/O57 (io), 95 VCC (power), 96 I/O58 (io), 97 I/O59 (io), 98 GND (power), 99 I/O60 (io), 100 I/O61 (io), 101 I/O62 (io), 102 I/O63 (io), 103 I/O64 (io), 104 I/O65 (io), 105 I/O66 (io), 106 I/O67 (io), 107 I/O68 (io), 108 I/O69 (io), 109 I/O70 (io), 110 I/O71 (io), 111 GND (power), 112 TMS/IN1 (in), 113 IN9 (in), 114 VCC (power), 115 I/O72 (io), 116 I/O73 (io), 117 I/O74 (io), 118 I/O75 (io), 119 I/O76 (io), 120 I/O77 (io), 121 I/O78 (io), 122 I/O79 (io), 123 I/O80 (io), 124 I/O81 (io), 125 I/O82 (io), 126 I/O83 (io), 127 GND (power), 128 I/O84 (io)

## ispLSI2192VL-135LB144
designator U?
2.5V In-System Programmable SuperFAST High Density PLD; Published: 17-Jul-2002; LatestRevisionDate: 13-Apr-2006; LatestRevisionNote: IPC-7351 Footprint Added.; DatasheetVersion: Oct-2000; PackageVersion: pkg_32, Aug-2005; PackageReference: fpBGA144; Publisher: Altium Limited; PackageDescription: 144-Ball Fine Pitch Ball Grid Array (fpBGA144); Code_IPC: BGA100P12X12-144; ComponentLink1Description: Manufacturer Link; ComponentLink1URL: http://www.latticesemi.com/products/mature/index.cfm; ComponentLink2Description: Datasheet; ComponentLink2URL: http://www.latticesemi.com/lit/docs/datasheets/cpld/2192vl.pdf
footprint fpBGA144 (BGA, 144-Leads, Body 13x13mm, Pitch 1mm)
3D model 2192VL-fpBGA144 (144-Ball Fine Pitch Ball Grid Array (fpBGA144))
pins: A1 GND (power), A2 I/O88 (io), A3 I/O84 (io), A4 I/O81 (io), A5 I/O77 (io), A6 I/O73 (io), A7 I/O70 (io), A8 I/O68 (io), A9 I/O64 (io), A10 I/O61 (io), A11 I/O59 (io), A12 GND (power), B1 VCC (power), B2 I/O86 (io), B3 I/O83 (io), B4 I/O80 (io), B5 I/O75 (io), B6 IN9 (in), B7 I/O69 (io), B8 I/O66 (io), B9 I/O63 (io), B10 I/O60 (io), B11 I/O56 (io), B12 VCC (power), C1 I/O91 (io), C2 I/O85 (io), C3 I/O82 (io), C4 I/O79 (io), C5 I/O76 (io), C6 I/O72 (io), C7 TDO/IN6 (io), C8 I/O67 (io), C9 I/O62 (io), C10 I/O58 (io), C11 I/O57 (io), C12 I/O53 (io), D1 I/O94 (io), D2 I/O87 (io), D3 I/O89 (io), D4 GND (power), D5 I/O78 (io), D6 I/O74 (io), D7 I/O71 (io), D8 I/O65 (io), D9 GND (power), D10 I/O54 (io), D11 I/O55 (io), D12 I/O49 (io), E1 IN11 (in), E2 I/O90 (io), E3 I/O92 (io), E4 I/O93 (io), E5 GND (power), E6 VCC (power), E7 VCC (power), E8 GND (power), E9 I/O50 (io), E10 I/O51 (io), E11 I/O52 (io), E12 IN8 (in), F1 ~{BSCAN} (in), F2 IN10 (in), F3 Y0 (in), F4 I/O95 (io), F5 VCC (power), F6 GND (power), F7 GND (power), F8 VCC (power), F9 IN4 (in), F10 Y1 (in), F11 I/O48 (io), F12 GOE0 (in), G1 I/O1 (io), G2 GOE1 (in), G3 TDI/IN0 (in), G4 ~{RESET} (in), G5 VCC (power), G6 GND (power), G7 GND (power), G8 VCC (power), G9 I/O47 (io), G10 IN5 (in), G11 Y2 (in), G12 TCK/IN7 (in), H1 I/O3 (io), H2 I/O2 (io), H3 I/O4 (io), H4 I/O0 (io), H5 GND (power), H6 VCC (power), H7 VCC (power), H8 GND (power), H9 I/O43 (io), H10 I/O46 (io), H11 I/O44 (io), H12 I/O45 (io), J1 I/O5 (io), J2 I/O8 (io), J3 I/O6 (io), J4 GND (power), J5 I/O17 (io), J6 TMS/IN1 (in), J7 IN3 (in), J8 I/O26 (io), J9 GND (power), J10 I/O42 (io), J11 I/O40 (io), J12 I/O41 (io), K1 I/O7 (io), K2 NC, K3 I/O12 (io), K4 I/O15 (io), K5 I/O19 (io), K6 I/O23 (io), K7 I/O25 (io), K8 I/O29 (io), K9 I/O32 (io), K10 I/O36 (io), K11 I/O37 (io), K12 I/O39 (io), L1 VCC (power), L2 I/O10 (io), L3 I/O11 (io), L4 I/O14 (io), L5 I/O20 (io), L6 I/O22 (io), L7 I/O24 (io), L8 I/O28 (io), L9 I/O31 (io), L10 I/O34 (io), L11 I/O38 (io), L12 VCC (power), M1 GND (power), M2 I/O9 (io), M3 I/O13 (io), M4 I/O16 (io), M5 I/O18 (io), M6 I/O21 (io), M7 IN2 (in), M8 I/O27 (io), M9 I/O30 (io), M10 I/O33 (io), M11 I/O35 (io), M12 GND (power)

## ispLSI2192VL-135LT128
designator U?
2.5V In-System Programmable SuperFAST High Density PLD; Published: 17-Jul-2002; LatestRevisionDate: 13-Apr-2006; LatestRevisionNote: IPC-7351 Footprint Added.; DatasheetVersion: Oct-2000; PackageVersion: Aug-2005; PackageReference: TQFP128; Publisher: Altium Limited; PackageDescription: 128-Pin Thin Quad Flat Pack 0.4 mm Pitch; ComponentLink1Description: Manufacturer Link; ComponentLink1URL: http://www.latticesemi.com/products/mature/index.cfm; ComponentLink2Description: Datasheet; ComponentLink2URL: http://www.latticesemi.com/lit/docs/datasheets/cpld/2192vl.pdf
footprint TQFP128_N (Thin QFP, 128-Leads, Body 14x14mm, Pitch 0.4mm, IPC Medium Density)
footprint TQFP128_L (Thin QFP, 128-Leads, Body 14x14mm, Pitch 0.4mm, IPC High Density)
footprint TQFP128_M (Thin QFP, 128-Leads, Body 14x14mm, Pitch 0.4mm, IPC Low Density)
3D model 2192VL-TQFP128 (128-Pin Thin Quad Flat Pack 0.4 mm Pitch)
pins: 1 I/O85 (io), 2 VCC (power), 3 I/O86 (io), 4 I/O87 (io), 5 I/O88 (io), 6 I/O89 (io), 7 I/O90 (io), 8 I/O91 (io), 9 I/O92 (io), 10 I/O93 (io), 11 I/O94 (io), 12 I/O95 (io), 13 IN10 (in), 14 Y0 (in), 15 ~{RESE}T (in), 16 VCC (power), 17 GOE1 (in), 18 GND (power), 19 ~{BSCAN} (in), 20 TDI/IN0 (in), 21 I/O0 (io), 22 I/O1 (io), 23 I/O2 (io), 24 I/O3 (io), 25 I/O4 (io), 26 I/O5 (io), 27 I/O6 (io), 28 I/O7 (io), 29 I/O8 (io), 30 I/O9 (io), 31 VCC (power), 32 I/O10 (io), 33 I/O11 (io), 34 GND (power), 35 I/O12 (io), 36 I/O13 (io), 37 I/O14 (io), 38 I/O15 (io), 39 I/O16 (io), 40 I/O17 (io), 41 I/O18 (io), 42 I/O19 (io), 43 I/O20 (io), 44 I/O21 (io), 45 I/O22 (io), 46 I/O23 (io), 47 VCC (power), 48 TDO/IN6 (io), 49 IN3 (in), 50 GND (power), 51 I/O24 (io), 52 I/O25 (io), 53 I/O26 (io), 54 I/O27 (io), 55 I/O28 (io), 56 I/O29 (io), 57 I/O30 (io), 58 I/O31 (io), 59 I/O32 (io), 60 I/O33 (io), 61 I/O34 (io), 62 I/O35 (io), 63 GND (power), 64 I/O36 (io), 65 I/O37 (io), 66 VCC (power), 67 I/O38 (io), 68 I/O39 (io), 69 I/O40 (io), 70 I/O41 (io), 71 I/O42 (io), 72 I/O43 (io), 73 I/O44 (io), 74 I/O45 (io), 75 I/O46 (io), 76 I/O47 (io), 77 TCK/IN7 (in), 78 Y2 (in), 79 GND (power), 80 GOE0 (in), 81 VCC (power), 82 IN4 (in), 83 Y1 (in), 84 IN8 (in), 85 I/O48 (io), 86 I/O49 (io), 87 I/O50 (io), 88 I/O51 (io), 89 I/O52 (io), 90 I/O53 (io), 91 I/O54 (io), 92 I/O55 (io), 93 I/O56 (io), 94 I/O57 (io), 95 VCC (power), 96 I/O58 (io), 97 I/O59 (io), 98 GND (power), 99 I/O60 (io), 100 I/O61 (io), 101 I/O62 (io), 102 I/O63 (io), 103 I/O64 (io), 104 I/O65 (io), 105 I/O66 (io), 106 I/O67 (io), 107 I/O68 (io), 108 I/O69 (io), 109 I/O70 (io), 110 I/O71 (io), 111 GND (power), 112 TMS/IN1 (in), 113 IN9 (in), 114 VCC (power), 115 I/O72 (io), 116 I/O73 (io), 117 I/O74 (io), 118 I/O75 (io), 119 I/O76 (io), 120 I/O77 (io), 121 I/O78 (io), 122 I/O79 (io), 123 I/O80 (io), 124 I/O81 (io), 125 I/O82 (io), 126 I/O83 (io), 127 GND (power), 128 I/O84 (io)

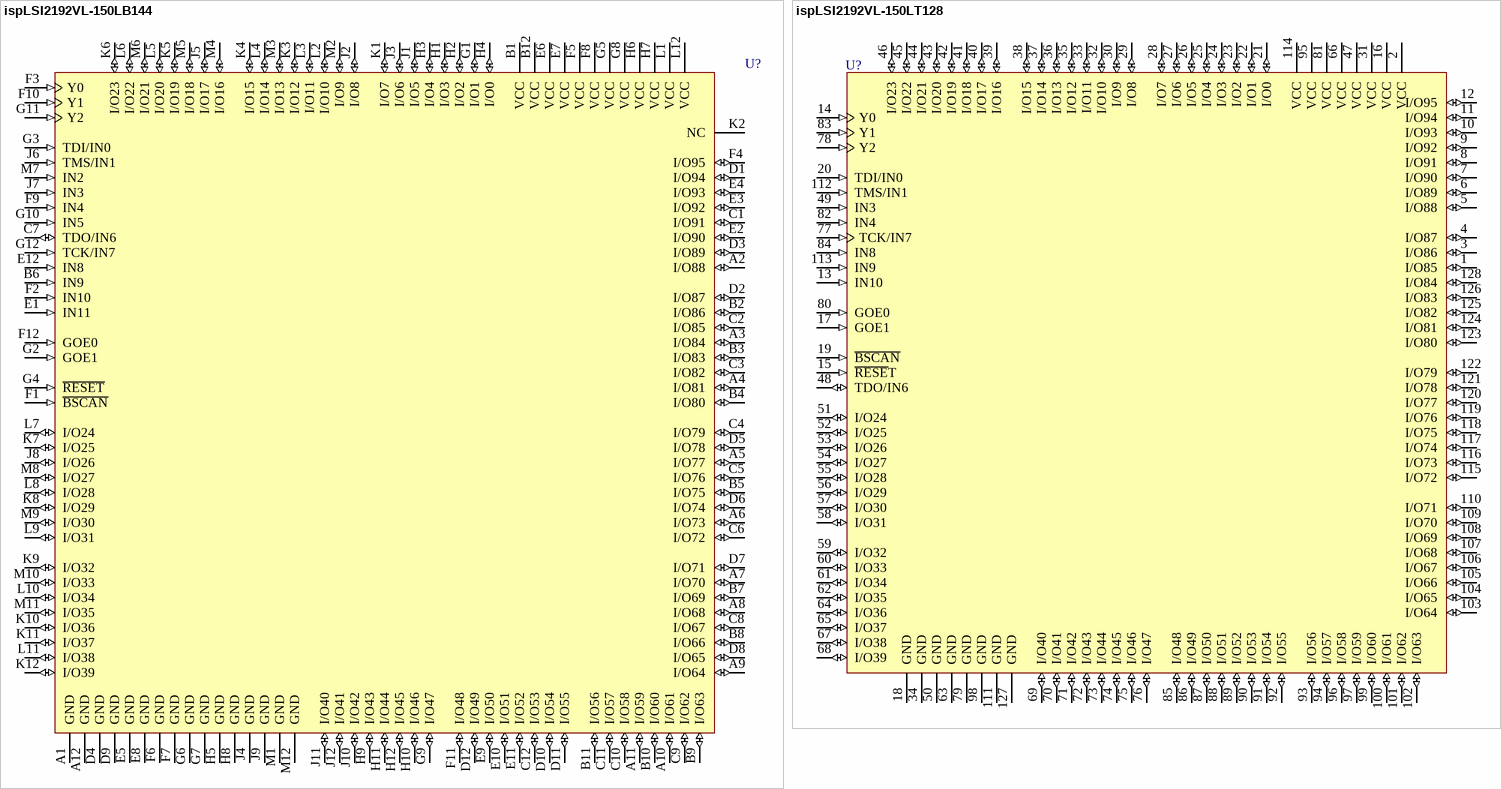
[diagram p112: symbols ispLSI2192VL-150LB144 to ispLSI2192VL-150LT128]